# Altium footprint library Connectors.PcbLib: 133 footprints (part 5 of 9)
Each footprint in its own frame and in the unit in brackets; x right, y up, seen from the top. Pads: shape width x height; smd on the part's side, far side on the other; paste and mask are expansions set on the pad; w line width, h text height; cw(c..) or ccw(c..) is an arc to the next point about the centre after c.
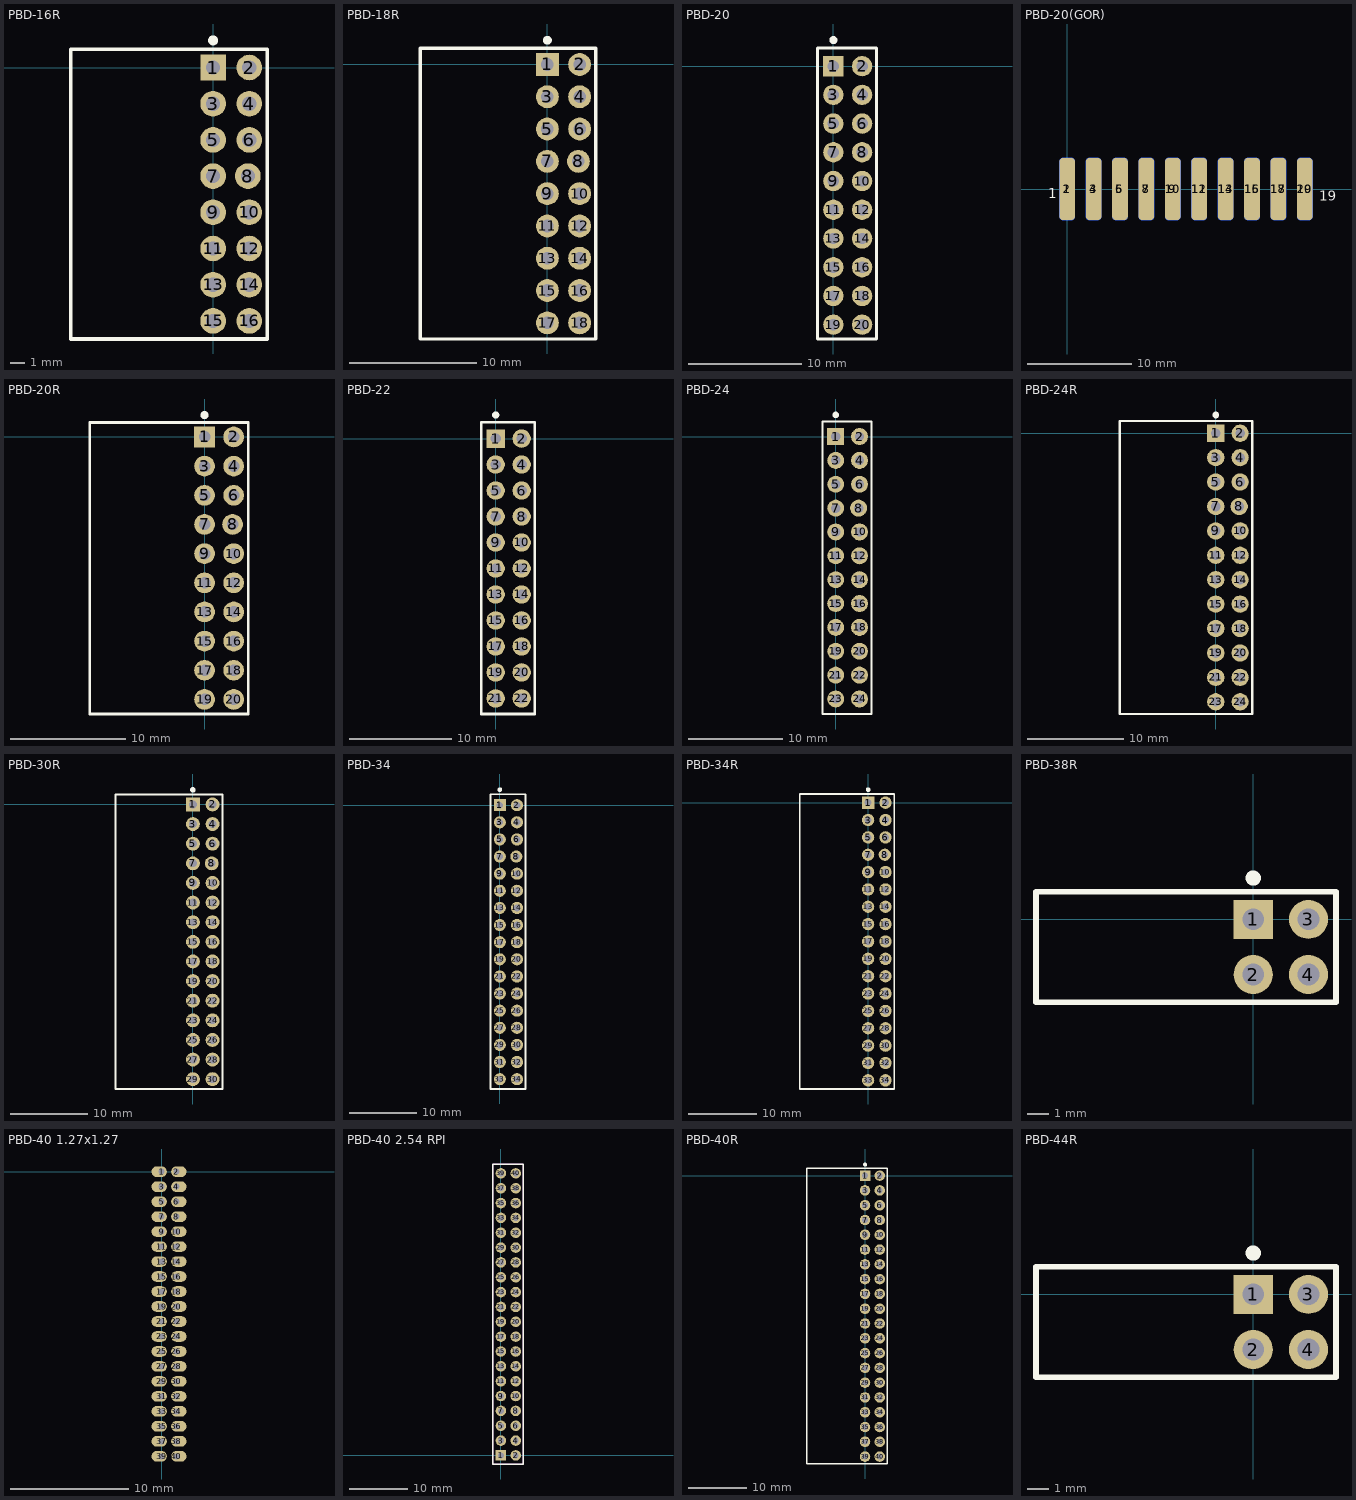
[diagram p4: the footprints below, top view; thin cyan lines are the x and y axes]

## PBD-16R [mm]
pads (16):
  rect 1.8x1.8 hole 1: 1(0,0)
  round 1.8 hole 1: 2(2.54,0) 3(0,-2.54) 4(2.54,-2.54) 5(0,-5.08) 6(2.54,-5.08) 7(0,-7.62) 8(2.44,-7.62) 9(0,-10.16) 10(2.54,-10.16) 11(0,-12.7) 12(2.54,-12.7) 13(0,-15.24) 14(2.54,-15.24) 15(0,-17.78) 16(2.54,-17.78)
Top Overlay:
  circle w0.5: c0,1.9 r0.1
  lines w0.254: -10,-19.05 -10,1.27 3.81,1.27 3.81,-19.05 -10,-19.05
3D body "PBD-04R.step": height 5, standoff -3, extent -10,-13.97 3,-8.89
3D body "PBD-04R.step": height 5, standoff -3, extent -10,-8.89 3,-3.81
3D body "PBD-04R.step": height 5, standoff -3, extent -10,-3.81 3,1.27
3D body "PBD-04R.step": height 5, standoff -3, extent -10,-19.05 3,-13.97

## PBD-18R [mm]
pads (18):
  rect 1.8x1.8 hole 1: 1(0,0)
  round 1.8 hole 1: 2(2.54,0) 3(0,-2.54) 4(2.54,-2.54) 5(0,-5.08) 6(2.54,-5.08) 7(0,-7.62) 8(2.44,-7.62) 9(0,-10.16) 10(2.54,-10.16) 11(0,-12.7) 12(2.54,-12.7) 13(0,-15.24) 14(2.54,-15.24) 15(0,-17.78) 16(2.54,-17.78) 17(0,-20.32) 18(2.54,-20.32)
Top Overlay:
  circle w0.5: c0,1.9 r0.1
  lines w0.254: -10,-21.59 -10,1.27 3.81,1.27 3.81,-21.59 -10,-21.59
3D body "PBD-04R.step": height 5, standoff -3, extent -10,-13.97 3,-8.89
3D body "PBD-04R.step": height 5, standoff -3, extent -10,-8.89 3,-3.81
3D body "PBD-04R.step": height 5, standoff -3, extent -10,-3.81 3,1.27
3D body "PBD-04R.step": height 5, standoff -3, extent -10,-19.05 3,-13.97
3D body "PBD-04R.step": height 5, standoff -3, extent -10,-21.59 3,-16.51

## PBD-20 [mm]
pads (20):
  rect 1.8x1.8 hole 1: 1(0,0)
  round 1.8 hole 1: 2(2.54,0) 3(0,-2.54) 4(2.54,-2.54) 5(0,-5.08) 6(2.54,-5.08) 7(0,-7.62) 8(2.54,-7.62) 9(0,-10.16) 10(2.54,-10.16) 11(0,-12.7) 12(2.54,-12.7) 13(0,-15.24) 14(2.54,-15.24) 15(0,-17.78) 16(2.54,-17.78) 17(0,-20.32) 18(2.54,-20.32) 19(0,-22.86) 20(2.54,-22.86)
Top Overlay:
  circle w0.5: c0,2.3 r0.1
  lines w0.254: -1.4,-24.13 -1.4,1.6 3.81,1.6 3.81,-24.13 -1.4,-24.13
3D body "PBD2_54-8.step": height 8.5, standoff -3, extent -1.27,-19.25 3.73,1.57
3D body "PBD2_54-8.step": height 8.5, standoff -3, extent -1.27,-24.33 3.73,-3.51

## PBD-20(GOR) [mm]
pads (20):
  rrect50% 1.5x6 smd: 1(0,0) 3(2.54,0) 5(5.08,0) 7(7.62,0) 9(10.16,0) 11(12.7,0) 13(15.24,0) 15(17.78,0) 17(20.32,0) 19(22.86,0)
  rrect50% 1.5x6 smd far side: 2(0,0) 4(2.54,0) 6(5.08,0) 8(7.62,0) 10(10.16,0) 12(12.7,0) 14(15.24,0) 16(17.78,0) 18(20.32,0) 20(22.86,0)
Top Overlay:
  text "1" at -1.829,-1.245 h1.6
  text "19" at 24.232,-1.473 h1.6
Bottom Overlay:
  text "2" at -1.168,-1.27 h1.6
  text "20" at 25.781,-1.473 h1.6
3D body "PBD2_54-8.step": height 1.6, standoff -3.4, extent 3.56,0.81 24.38,12.31
3D body "PBD2_54-8.step": height 1.6, standoff -3.4, extent -1.52,0.81 19.3,12.31

## PBD-20R [mm]
pads (20):
  rect 1.8x1.8 hole 1: 1(0,0)
  round 1.8 hole 1: 2(2.54,0) 3(0,-2.54) 4(2.54,-2.54) 5(0,-5.08) 6(2.54,-5.08) 7(0,-7.62) 8(2.44,-7.62) 9(0,-10.16) 10(2.54,-10.16) 11(0,-12.7) 12(2.54,-12.7) 13(0,-15.24) 14(2.54,-15.24) 15(0,-17.78) 16(2.54,-17.78) 17(0,-20.32) 18(2.54,-20.32) 19(0,-22.86) 20(2.54,-22.86)
Top Overlay:
  circle w0.5: c0,1.9 r0.1
  lines w0.254: -10,-24.13 -10,1.27 3.81,1.27 3.81,-24.13 -10,-24.13
3D body "PBD-04R.step": height 5, standoff -3, extent -10,-13.97 3,-8.89
3D body "PBD-04R.step": height 5, standoff -3, extent -10,-8.89 3,-3.81
3D body "PBD-04R.step": height 5, standoff -3, extent -10,-3.81 3,1.27
3D body "PBD-04R.step": height 5, standoff -3, extent -10,-19.05 3,-13.97
3D body "PBD-04R.step": height 5, standoff -3, extent -10,-24.13 3,-19.05

## PBD-22 [mm]
pads (22):
  rect 1.8x1.8 hole 1: 1(0,0)
  round 1.8 hole 1: 2(2.54,0) 3(0,-2.54) 4(2.54,-2.54) 5(0,-5.08) 6(2.54,-5.08) 7(0,-7.62) 8(2.54,-7.62) 9(0,-10.16) 10(2.54,-10.16) 11(0,-12.7) 12(2.54,-12.7) 13(0,-15.24) 14(2.54,-15.24) 15(0,-17.78) 16(2.54,-17.78) 17(0,-20.32) 18(2.54,-20.32) 19(0,-22.86) 20(2.54,-22.86) 21(0,-25.4) 22(2.54,-25.4)
Top Overlay:
  circle w0.5: c0,2.3 r0.1
  lines w0.254: -1.4,-26.924 3.81,-26.924 3.81,1.6 -1.4,1.6 -1.4,-26.924
3D body "PBD2_54-8.step": height 8.5, standoff -3, extent -1.27,-26.87 3.73,-6.05
3D body "PBD2_54-8.step": height 8.5, standoff -3, extent -1.27,-19.25 3.73,1.57

## PBD-24 [mm]
pads (24):
  rect 1.8x1.8 hole 1: 1(0,0)
  round 1.8 hole 1: 2(2.54,0) 3(0,-2.54) 4(2.54,-2.54) 5(0,-5.08) 6(2.54,-5.08) 7(0,-7.62) 8(2.44,-7.62) 9(0,-10.16) 10(2.54,-10.16) 11(0,-12.7) 12(2.54,-12.7) 13(0,-15.24) 14(2.54,-15.24) 15(0,-17.78) 16(2.54,-17.78) 17(0,-20.32) 18(2.54,-20.32) 19(0,-22.86) 20(2.54,-22.86) 21(0,-25.4) 22(2.54,-25.4) 23(0,-27.94) 24(2.54,-27.94)
Top Overlay:
  circle w0.5: c0,2.3 r0.1
  lines w0.254: -1.4,-29.54 -1.4,1.6 3.81,1.6 3.81,-29.54 ; -1.27,-29.54 3.73,-29.54
3D body "PBD2_54-8.step": height 8.5, standoff -3, extent -1.27,-19.25 3.73,1.57
3D body "PBD2_54-8.step": height 8.5, standoff -3, extent -1.27,-29.41 3.73,-8.59

## PBD-24R [mm]
pads (24):
  rect 1.8x1.8 hole 1: 1(0,0)
  round 1.8 hole 1: 2(2.54,0) 3(0,-2.54) 4(2.54,-2.54) 5(0,-5.08) 6(2.54,-5.08) 7(0,-7.62) 8(2.44,-7.62) 9(0,-10.16) 10(2.54,-10.16) 11(0,-12.7) 12(2.54,-12.7) 13(0,-15.24) 14(2.54,-15.24) 15(0,-17.78) 16(2.54,-17.78) 17(0,-20.32) 18(2.54,-20.32) 19(0,-22.86) 20(2.54,-22.86) 21(0,-25.4) 22(2.54,-25.4) 23(0,-27.94) 24(2.54,-27.94)
Top Overlay:
  circle w0.5: c0,1.9 r0.1
  lines w0.254: -10,-29.21 -10,1.27 3.81,1.27 3.81,-29.21 -10,-29.21
3D body "PBD-04R.step": height 5, standoff -3, extent -10,-29.21 3,-24.13
3D body "PBD-04R.step": height 5, standoff -3, extent -10,-13.97 3,-8.89
3D body "PBD-04R.step": height 5, standoff -3, extent -10,-8.89 3,-3.81
3D body "PBD-04R.step": height 5, standoff -3, extent -10,-3.81 3,1.27
3D body "PBD-04R.step": height 5, standoff -3, extent -10,-19.05 3,-13.97
3D body "PBD-04R.step": height 5, standoff -3, extent -10,-24.13 3,-19.05

## PBD-30R [mm]
pads (30):
  rect 1.8x1.8 hole 1: 1(0,0)
  round 1.8 hole 1: 2(2.54,0) 3(0,-2.54) 4(2.54,-2.54) 5(0,-5.08) 6(2.54,-5.08) 7(0,-7.62) 8(2.44,-7.62) 9(0,-10.16) 10(2.54,-10.16) 11(0,-12.7) 12(2.54,-12.7) 13(0,-15.24) 14(2.54,-15.24) 15(0,-17.78) 16(2.54,-17.78) 17(0,-20.32) 18(2.54,-20.32) 19(0,-22.86) 20(2.54,-22.86) 21(0,-25.4) 22(2.54,-25.4) 23(0,-27.94) 24(2.54,-27.94) 25(0,-30.48) 26(2.54,-30.48) 27(0,-33.02) 28(2.54,-33.02) 29(0,-35.56) 30(2.54,-35.56)
Top Overlay:
  circle w0.5: c0,1.9 r0.1
  lines w0.254: -10,-36.83 3.81,-36.83 3.81,1.27 -10,1.27 -10,-36.83
3D body "PBD-04R.step": height 5, standoff -3, extent -10,-36.83 3,-31.75
3D body "PBD-04R.step": height 5, standoff -3, extent -10,-34.29 3,-29.21
3D body "PBD-04R.step": height 5, standoff -3, extent -10,-24.13 3,-19.05
3D body "PBD-04R.step": height 5, standoff -3, extent -10,-19.05 3,-13.97
3D body "PBD-04R.step": height 5, standoff -3, extent -10,-3.81 3,1.27
3D body "PBD-04R.step": height 5, standoff -3, extent -10,-8.89 3,-3.81
3D body "PBD-04R.step": height 5, standoff -3, extent -10,-13.97 3,-8.89
3D body "PBD-04R.step": height 5, standoff -3, extent -10,-29.21 3,-24.13

## PBD-34 [mm]
pads (34):
  rect 1.8x1.8 hole 1: 1(0,0)
  round 1.8 hole 1: 2(2.54,0) 3(0,-2.54) 4(2.54,-2.54) 5(0,-5.08) 6(2.54,-5.08) 7(0,-7.62) 8(2.44,-7.62) 9(0,-10.16) 10(2.54,-10.16) 11(0,-12.7) 12(2.54,-12.7) 13(0,-15.24) 14(2.54,-15.24) 15(0,-17.78) 16(2.54,-17.78) 17(0,-20.32) 18(2.54,-20.32) 19(0,-22.86) 20(2.54,-22.86) 21(0,-25.4) 22(2.54,-25.4) 23(0,-27.94) 24(2.54,-27.94) 25(0,-30.48) 26(2.54,-30.48) 27(0,-33.02) 28(2.54,-33.02) 29(0,-35.56) 30(2.54,-35.56) 31(0,-38.1) 32(2.54,-38.1) 33(0,-40.64) 34(2.54,-40.64)
Top Overlay:
  circle w0.5: c0,2.3 r0.1
  lines w0.254: -1.4,-42.1 -1.4,1.6 3.81,1.6 3.81,-42.1 -1.4,-42.1
3D body "PBD2_54-8.step": height 8.5, standoff -3, extent -1.27,-42.11 3.73,-21.29
3D body "PBD2_54-8.step": height 8.5, standoff -3, extent -1.27,-39.57 3.73,-18.75
3D body "PBD2_54-8.step": height 8.5, standoff -3, extent -1.27,-19.25 3.73,1.57

## PBD-34R [mm]
pads (34):
  rect 1.8x1.8 hole 1: 1(0,0)
  round 1.8 hole 1: 2(2.54,0) 3(0,-2.54) 4(2.54,-2.54) 5(0,-5.08) 6(2.54,-5.08) 7(0,-7.62) 8(2.44,-7.62) 9(0,-10.16) 10(2.54,-10.16) 11(0,-12.7) 12(2.54,-12.7) 13(0,-15.24) 14(2.54,-15.24) 15(0,-17.78) 16(2.54,-17.78) 17(0,-20.32) 18(2.54,-20.32) 19(0,-22.86) 20(2.54,-22.86) 21(0,-25.4) 22(2.54,-25.4) 23(0,-27.94) 24(2.54,-27.94) 25(0,-30.48) 26(2.54,-30.48) 27(0,-33.02) 28(2.54,-33.02) 29(0,-35.56) 30(2.54,-35.56) 31(0,-38.1) 32(2.54,-38.1) 33(0,-40.64) 34(2.54,-40.64)
Top Overlay:
  circle w0.5: c0,1.9 r0.1
  lines w0.254: -10,-41.91 -10,1.27 3.81,1.27 3.81,-41.91 -10,-41.91
3D body "PBD-04R.step": height 5, standoff -3, extent -10,-29.21 3,-24.13
3D body "PBD-04R.step": height 5, standoff -3, extent -10,-13.97 3,-8.89
3D body "PBD-04R.step": height 5, standoff -3, extent -10,-8.89 3,-3.81
3D body "PBD-04R.step": height 5, standoff -3, extent -10,-3.81 3,1.27
3D body "PBD-04R.step": height 5, standoff -3, extent -10,-19.05 3,-13.97
3D body "PBD-04R.step": height 5, standoff -3, extent -10,-24.13 3,-19.05
3D body "PBD-04R.step": height 5, standoff -3, extent -10,-34.29 3,-29.21
3D body "PBD-04R.step": height 5, standoff -3, extent -10,-39.37 3,-34.29
3D body "PBD-04R.step": height 5, standoff -3, extent -10,-41.91 3,-36.83

## PBD-38R [mm]
pads (4):
  rect 1.8x1.8 hole 1: 1(0,0)
  round 1.8 hole 1: 2(0,-2.54) 3(2.54,0) 4(2.54,-2.54)
Top Overlay:
  circle w0.5: c0,1.9 r0.1
  lines w0.254: -10,-3.81 3.81,-3.81 3.81,1.27 -10,1.27 -10,-3.81
3D body "PBD-04R.step": height 5, standoff -3, extent -10,-3.81 3,1.27

## PBD-40 1.27x1.27 [mm]
pads (40):
  oval 1.3x0.9 hole 0.5 copper offset -0.2,0: 1(0,0) 3(0,-1.27) 5(0,-2.54) 7(0,-3.81) 9(0,-5.08) 11(0,-6.35) 13(0,-7.62) 15(0,-8.89) 17(0,-10.16) 19(0,-11.43) 21(0,-12.7) 23(0,-13.97) 25(0,-15.24) 27(0,-16.51) 29(0,-17.78) 31(0,-19.05) 33(0,-20.32) 35(0,-21.59) 37(0,-22.86) 39(0,-24.13)
  oval 1.3x0.9 hole 0.5 copper offset 0.2,0: 2(1.27,0) 4(1.27,-1.27) 6(1.27,-2.54) 8(1.27,-3.81) 10(1.27,-5.08) 12(1.27,-6.35) 14(1.27,-7.62) 16(1.27,-8.89) 18(1.27,-10.16) 20(1.27,-11.43) 22(1.27,-12.7) 24(1.27,-13.97) 26(1.27,-15.24) 28(1.27,-16.51) 30(1.27,-17.78) 32(1.27,-19.05) 34(1.27,-20.32) 36(1.27,-21.59) 38(1.27,-22.86) 40(1.27,-24.13)
3D body "PBD-1.27-40.step": height 4.5, standoff -2.6, extent -0.866,-24.765 2.134,0.635

## PBD-40 2.54 RPI [mm] "For rasspberry. Miror"
pads (40):
  rect 1.8x1.8 hole 1: 1(0,0)
  round 1.8 hole 1: 2(2.54,0) 3(0,2.54) 4(2.54,2.54) 5(0,5.08) 6(2.54,5.08) 7(0,7.62) 8(2.54,7.62) 9(0,10.16) 10(2.54,10.16) 11(0,12.7) 12(2.54,12.7) 13(0,15.24) 14(2.54,15.24) 15(0,17.78) 16(2.54,17.78) 17(0,20.32) 18(2.54,20.32) 19(0,22.86) 20(2.54,22.86) 21(0,25.4) 22(2.54,25.4) 23(0,27.94) 24(2.54,27.94) 25(0,30.48) 26(2.54,30.48) 27(0,33.02) 28(2.54,33.02) 29(0,35.56) 30(2.54,35.56) 31(0,38.1) 32(2.54,38.1) 33(0,40.64) 34(2.54,40.64) 35(0,43.18) 36(2.54,43.18) 37(0,45.72) 38(2.54,45.72) 39(0,48.26) 40(2.54,48.26)
Top Overlay:
  lines w0.254: -1.4,24.13 -1.4,49.86 3.81,49.86 3.81,24.13 ; -1.4,24.46 -1.4,-1.47 3.81,-1.47 3.81,24.46
Mechanical 29:
  lines w0.254: -1.4,-1.47 -1.4,49.86 3.81,49.86 3.81,-1.47 -1.4,-1.47
  text ".Designator" at -0.8,44.06 h1
3D body "PBD2_54-8.step": height 8.5, standoff -3, extent -1.27,23.93 3.73,44.75
3D body "PBD2_54-8.step": height 8.5, standoff -3, extent -1.27,29.01 3.73,49.83
3D body "PBD2_54-8.step": height 8.5, standoff -3, extent -1.27,3.61 3.73,24.43
3D body "PBD2_54-8.step": height 8.5, standoff -3, extent -1.27,-1.47 3.73,19.35

## PBD-40R [mm]
pads (40):
  rect 1.8x1.8 hole 1: 1(0,0)
  round 1.8 hole 1: 2(2.54,0) 3(0,-2.54) 4(2.54,-2.54) 5(0,-5.08) 6(2.54,-5.08) 7(0,-7.62) 8(2.54,-7.62) 9(0,-10.16) 10(2.54,-10.16) 11(0,-12.7) 12(2.54,-12.7) 13(0,-15.24) 14(2.54,-15.24) 15(0,-17.78) 16(2.54,-17.78) 17(0,-20.32) 18(2.54,-20.32) 19(0,-22.86) 20(2.54,-22.86) 21(0,-25.4) 22(2.54,-25.4) 23(0,-27.94) 24(2.54,-27.94) 25(0,-30.48) 26(2.54,-30.48) 27(0,-33.02) 28(2.54,-33.02) 29(0,-35.56) 30(2.54,-35.56) 31(0,-38.1) 32(2.54,-38.1) 33(0,-40.64) 34(2.54,-40.64) 35(0,-43.18) 36(2.54,-43.18) 37(0,-45.72) 38(2.54,-45.72) 39(0,-48.26) 40(2.54,-48.26)
Top Overlay:
  circle w0.5: c0,1.9 r0.1
  lines w0.254: -10,-49.53 -10,-19.05 -10,-13.97 -10,-8.89 -10,-3.81 -10,1.27 3.81,1.27 3.81,-3.81 3.81,-8.89 3.81,-13.97 3.81,-19.05 3.81,-49.53 -10,-49.53
3D body "PBD-04R.step": height 5, standoff -3, extent -10,-49.53 3,-44.45
3D body "PBD-04R.step": height 5, standoff -3, extent -10,-44.45 3,-39.37
3D body "PBD-04R.step": height 5, standoff -3, extent -10,-39.37 3,-34.29
3D body "PBD-04R.step": height 5, standoff -3, extent -10,-34.29 3,-29.21
3D body "PBD-04R.step": height 5, standoff -3, extent -10,-29.21 3,-24.13
3D body "PBD-04R.step": height 5, standoff -3, extent -10,-24.13 3,-19.05
3D body "PBD-04R.step": height 5, standoff -3, extent -10,-19.05 3,-13.97
3D body "PBD-04R.step": height 5, standoff -3, extent -10,-13.97 3,-8.89
3D body "PBD-04R.step": height 5, standoff -3, extent -10,-8.89 3,-3.81
3D body "PBD-04R.step": height 5, standoff -3, extent -10,-3.81 3,1.27

## PBD-44R [mm]
pads (4):
  rect 1.8x1.8 hole 1: 1(0,0)
  round 1.8 hole 1: 2(0,-2.54) 3(2.54,0) 4(2.54,-2.54)
Top Overlay:
  circle w0.5: c0,1.9 r0.1
  lines w0.254: -10,-3.81 3.81,-3.81 3.81,1.27 -10,1.27 -10,-3.81
3D body "PBD-04R.step": height 5, standoff -3, extent -10,-3.81 3,1.27